# Altium footprint library CAP_TH.PcbLib: 219 footprints (part 10 of 14)
Each footprint in its own frame and in the unit in brackets; x right, y up, seen from the top. Pads: shape width x height; smd on the part's side, far side on the other; paste and mask are expansions set on the pad; w line width, h text height; cw(c..) or ccw(c..) is an arc to the next point about the centre after c.
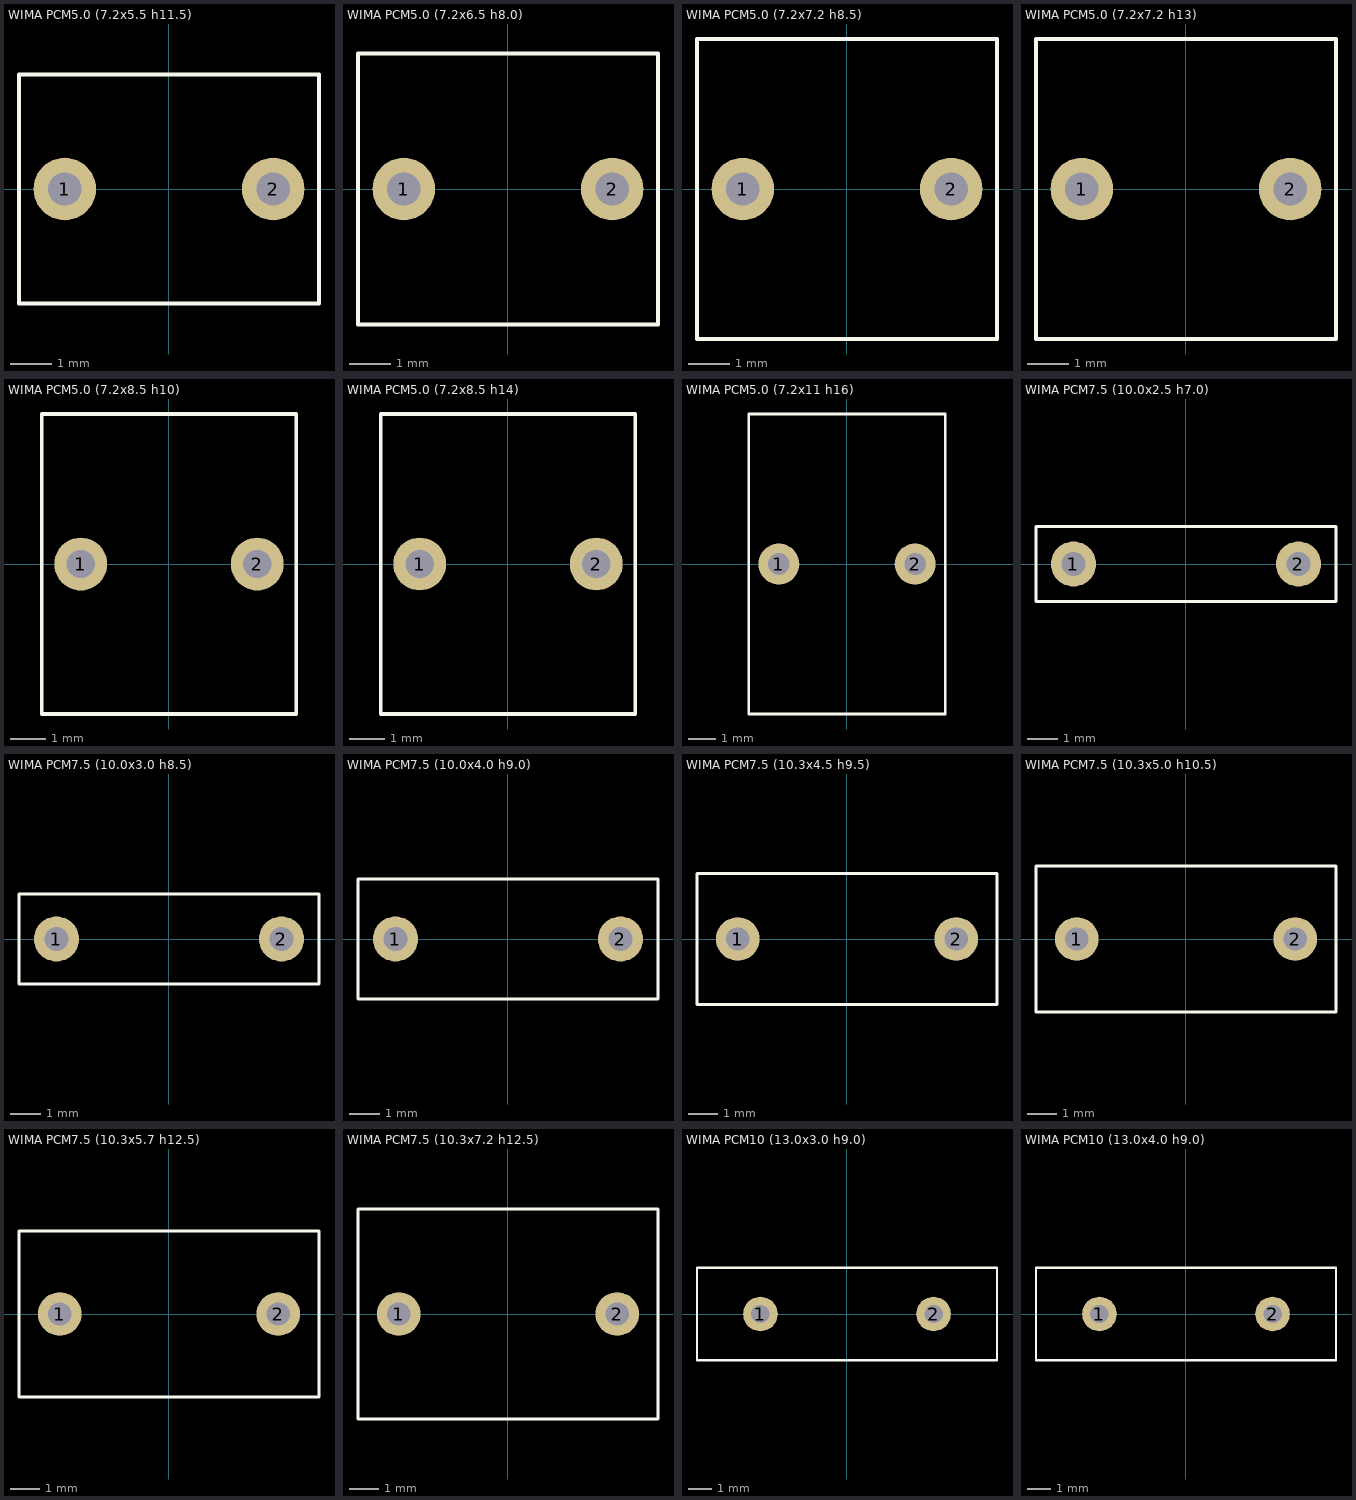
[diagram p9: the footprints below, top view; thin cyan lines are the x and y axes]

## WIMA PCM5.0 (7.2x5.5 h11.5) [mm]
pads (2):
  round 1.5 hole 0.8: 1(-2.5,0) 2(2.5,0)
Top Overlay:
  lines w0.1: -3.6,-2.75 3.6,-2.75 3.6,2.75 -3.6,2.75 -3.6,-2.75
3D body "WIMA PCM5.0 (7.2x5.5 h11.5).STEP": height 11.5, standoff -2, extent -3.6,-2.75 3.6,2.75

## WIMA PCM5.0 (7.2x6.5 h8.0) [mm]
pads (2):
  round 1.5 hole 0.8: 1(-2.5,0) 2(2.5,0)
Top Overlay:
  lines w0.1: -3.6,-3.25 3.6,-3.25 3.6,3.25 -3.6,3.25 -3.6,-3.25
3D body "WIMA PCM5.0 (7.2x6.5 h8.0).STEP": height 8, standoff -2, extent -3.6,-3.25 3.6,3.25

## WIMA PCM5.0 (7.2x7.2 h8.5) [mm]
pads (2):
  round 1.5 hole 0.8: 1(-2.5,0) 2(2.5,0)
Top Overlay:
  lines w0.1: -3.6,-3.6 -3.6,3.6 3.6,3.6 3.6,-3.6 -3.6,-3.6
3D body "WIMA PCM5.0 (7.2x7.2 h8.5).STEP": height 8.5, standoff -2, extent -3.6,-3.6 3.6,3.6

## WIMA PCM5.0 (7.2x7.2 h13) [mm]
pads (2):
  round 1.5 hole 0.8: 1(-2.5,0) 2(2.5,0)
Top Overlay:
  lines w0.1: -3.6,-3.6 3.6,-3.6 3.6,3.6 -3.6,3.6 -3.6,-3.6
3D body "WIMA PCM5.0 (7.2x7.2 h13).STEP": height 13, standoff -2, extent -3.6,-3.6 3.6,3.6

## WIMA PCM5.0 (7.2x8.5 h10) [mm]
pads (2):
  round 1.5 hole 0.8: 1(-2.5,0) 2(2.5,0)
Top Overlay:
  lines w0.1: -3.6,-4.25 -3.6,4.25 3.6,4.25 3.6,-4.25 -3.6,-4.25
3D body "WIMA PCM5.0 (7.2x8.5 h10).STEP": height 10, standoff -2, extent -3.6,-4.25 3.6,4.25

## WIMA PCM5.0 (7.2x8.5 h14) [mm]
pads (2):
  round 1.5 hole 0.8: 1(-2.5,0) 2(2.5,0)
Top Overlay:
  lines w0.1: -3.6,-4.25 -3.6,4.25 3.6,4.25 3.6,-4.25 -3.6,-4.25
3D body "WIMA PCM5.0 (7.2x8.5 h14).STEP": height 14, standoff -2, extent -3.6,-4.25 3.6,4.25

## WIMA PCM5.0 (7.2x11 h16) [mm]
pads (2):
  round 1.5 hole 0.8: 1(-2.5,0) 2(2.5,0)
Top Overlay:
  lines w0.1: -3.6,-5.5 3.6,-5.5 3.6,5.5 -3.6,5.5 -3.6,-5.5
3D body "WIMA PCM5.0 (7.2x11 h16).STEP": height 16, standoff -2, extent -3.6,-5.5 3.6,5.5

## WIMA PCM7.5 (10.0x2.5 h7.0) [mm]
pads (2):
  round 1.5 hole 0.8: 1(-3.75,0) 2(3.75,0)
Top Overlay:
  lines w0.1: -5,-1.25 -5,1.25 5,1.25 5,-1.25 -5,-1.25
3D body "WIMA PCM7.5 (10.0x2.5 h7.0).STEP": height 7, standoff -2, extent -5,-1.25 5,1.25

## WIMA PCM7.5 (10.0x3.0 h8.5) [mm]
pads (2):
  round 1.5 hole 0.8: 1(-3.75,0) 2(3.75,0)
Top Overlay:
  lines w0.1: -5,-1.5 -5,1.5 5,1.5 5,-1.5 -5,-1.5
3D body "WIMA PCM7.5 (10.0x3.0 h8.5).STEP": height 8.5, standoff -2, extent -5,-1.5 5,1.5

## WIMA PCM7.5 (10.0x4.0 h9.0) [mm]
pads (2):
  round 1.5 hole 0.8: 1(-3.75,0) 2(3.75,0)
Top Overlay:
  lines w0.1: -5,-2 -5,2 5,2 5,-2 -5,-2
3D body "WIMA PCM7.5 (10.0x4.0 h9.0).STEP": height 9, standoff -2, extent -5,-2 5,2

## WIMA PCM7.5 (10.3x4.5 h9.5) [mm]
pads (2):
  round 1.5 hole 0.8: 1(-3.75,0) 2(3.75,0)
Top Overlay:
  lines w0.1: -5.15,-2.25 5.15,-2.25 5.15,2.25 -5.15,2.25 -5.15,-2.25
3D body "WIMA PCM7.5 (10.3x4.5 h9.5).STEP": height 9.5, standoff -2, extent -5.15,-2.25 5.15,2.25

## WIMA PCM7.5 (10.3x5.0 h10.5) [mm]
pads (2):
  round 1.5 hole 0.8: 1(-3.75,0) 2(3.75,0)
Top Overlay:
  lines w0.1: -5.15,-2.5 5.15,-2.5 5.15,2.5 -5.15,2.5 -5.15,-2.5
3D body "WIMA PCM7.5 (10.3x5.0 h10.5).STEP": height 10.5, standoff -2, extent -5.15,-2.5 5.15,2.5

## WIMA PCM7.5 (10.3x5.7 h12.5) [mm]
pads (2):
  round 1.5 hole 0.8: 1(-3.75,0) 2(3.75,0)
Top Overlay:
  lines w0.1: -5.15,-2.85 5.15,-2.85 5.15,2.85 -5.15,2.85 -5.15,-2.85
3D body "WIMA PCM7.5 (10.3x5.7 h12.5).STEP": height 12.5, standoff -2, extent -5.15,-2.85 5.15,2.85

## WIMA PCM7.5 (10.3x7.2 h12.5) [mm]
pads (2):
  round 1.5 hole 0.8: 1(-3.75,0) 2(3.75,0)
Top Overlay:
  lines w0.1: -5.15,-3.6 -5.15,3.6 5.15,3.6 5.15,-3.6 -5.15,-3.6
3D body "WIMA PCM7.5 (10.3x7.2 h12.5).STEP": height 12.5, standoff -2, extent -5.15,-3.6 5.15,3.6

## WIMA PCM10 (13.0x3.0 h9.0) [mm]
pads (2):
  round 1.5 hole 0.8: 1(-3.75,0) 2(3.75,0)
Top Overlay:
  lines w0.1: -6.5,-2 -6.5,2 6.5,2 6.5,-2 -6.5,-2
3D body "WIMA RM10.0mm (13.0x4.0 h9.0).STEP": height 9, standoff -2, extent -6.5,-2 6.5,2

## WIMA PCM10 (13.0x4.0 h9.0) [mm]
pads (2):
  round 1.5 hole 0.8: 1(-3.75,0) 2(3.75,0)
Top Overlay:
  lines w0.1: -6.5,-2 -6.5,2 6.5,2 6.5,-2 -6.5,-2
3D body "WIMA RM10.0mm (13.0x4.0 h9.0).STEP": height 9, standoff -2, extent -6.5,-2 6.5,2